# Altium footprint library myLibraryAltium.PcbLib: 215 footprints (part 12 of 14)
Each footprint in its own frame and in the unit in brackets; x right, y up, seen from the top. Pads: shape width x height; smd on the part's side, far side on the other; paste and mask are expansions set on the pad; w line width, h text height; cw(c..) or ccw(c..) is an arc to the next point about the centre after c.
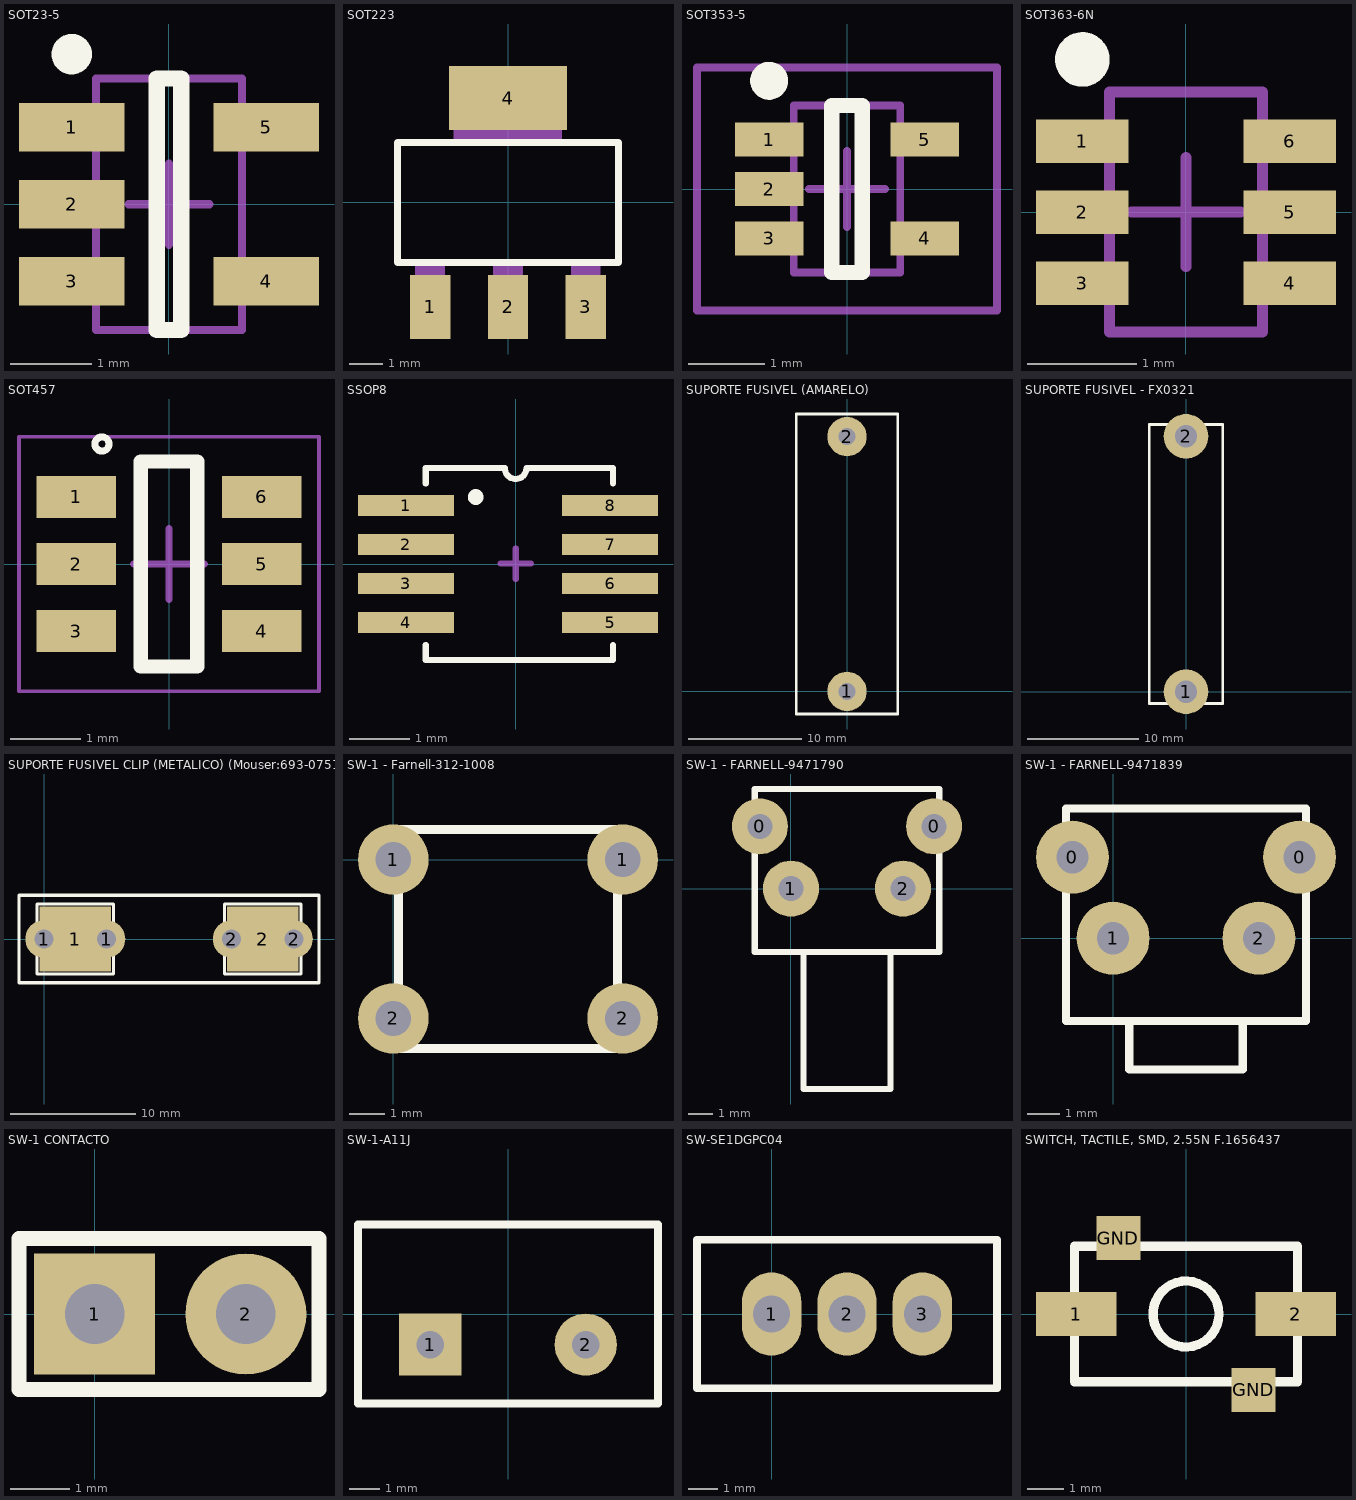
[diagram p11: the footprints below, top view; thin cyan lines are the x and y axes]

## SOT23-5 [mm] "SOT23, 5-Leads, Body 2.9x1.6mm, Pitch 0.95mm, Lead Span 2.8mm, IPC Low Density"
height 1.45
pads (5):
  rect 1.3x0.6 smd mask+0.05: 1(-1.2,0.95) 2(-1.2,0) 3(-1.2,-0.95) 4(1.2,-0.95) 5(1.2,0.95)
Top Overlay:
  circle w0.25: c-1.2,1.85 r0.125
  lines w0.2: -0.15,-1.55 -0.15,1.55 0.15,1.55 0.15,-1.55 -0.15,-1.55
Mechanical 13:
  lines w0.1: -0.9,-1.55 0.9,-1.55 0.9,1.55 -0.9,1.55 -0.9,-1.55
Mechanical 15:
  lines w0.1: -0.5,0 0.5,0 ; 0,-0.5 0,0.5
3D body "SW3DPS-SOT-23-5-DEFAULT.STEP": height 1.05, standoff -0.05, extent -1.275,-1.525 1.225,1.475

## SOT223 [mm]
pads (4):
  rect 1.2x1.9 smd: 1(-2.311,-3.099) 2(0,-3.099) 3(2.311,-3.099)
  rect 3.5x1.9 smd: 4(0,3.099)
Top Overlay:
  lines w0.203: -3.277,-1.778 -3.277,1.778 3.277,1.778 3.277,-1.778 -3.277,-1.778
Mechanical 1:
  region: 1.881,-1.803 2.743,-1.803 2.743,-3.66 1.881,-3.66
  region: -2.748,-1.803 -1.88,-1.803 -1.88,-3.664 -2.748,-3.664
  region: -0.432,-1.803 0.432,-1.803 0.432,-3.66 -0.432,-3.66
  region: -1.603,3.658 1.6,3.658 1.6,1.807 -1.603,1.807
  region: 1.883,-1.803 2.743,-1.803 2.743,-3.663 1.883,-3.663
  region: -2.747,-1.803 -1.88,-1.803 -1.88,-3.663 -2.747,-3.663
  region: -0.432,-1.803 0.432,-1.803 0.432,-3.662 -0.432,-3.662
  region: -1.601,3.658 1.6,3.658 1.6,1.804 -1.601,1.804
3D body "User Library-SOT223-3.STEP": height 1.7, standoff 0, extent -3.25,-3.5 3.25,3.5

## SOT353-5 [mm] "SOT353, 5-Leads, Body 2x1.3mm, Pitch 0.65mm, Lead Span 2.1mm, IPC Low Density"
height 1.1
pads (5):
  rect 0.9x0.45 smd: 1(-1.025,0.65) 2(-1.025,0) 3(-1.025,-0.65) 4(1.025,-0.65) 5(1.025,0.65)
Top Overlay:
  circle w0.25: c-1.025,1.425 r0.125
  lines w0.2: -0.2,-1.1 0.2,-1.1 0.2,1.1 -0.2,1.1 -0.2,-1.1
Mechanical 13:
  lines w0.1: -0.7,-1.1 -0.7,1.1 0.7,1.1 0.7,-1.1 -0.7,-1.1
Mechanical 15:
  lines w0.1: -0.5,0 0.5,0 ; 0,-0.5 0,0.5 ; -1.975,-1.6 -1.975,1.6 1.975,1.6 1.975,-1.6 -1.975,-1.6
3D body: height 1.1, standoff 0, extent -0.7,-1.1 0.7,1.1

## SOT363-6N [mm] "SOT363, 6-Leads, Body 2x1.3mm, Pitch 0.65mm, Lead Span 2.1mm, IPC Medium Density"
height 1
pads (6):
  rect 0.85x0.4 smd: 1(-0.95,0.65) 2(-0.95,0) 3(-0.95,-0.65) 4(0.95,-0.65) 5(0.95,0) 6(0.95,0.65)
Top Overlay:
  circle w0.25: c-0.95,1.4 r0.125
Mechanical 13:
  lines w0.1: -0.7,-1.1 -0.7,1.1 0.7,1.1 0.7,-1.1 -0.7,-1.1
Mechanical 15:
  lines w0.1: -0.5,0 0.5,0 ; 0,-0.5 0,0.5
3D body: height 1, standoff 0, extent -0.7,-1.1 0.7,1.1

## SOT457 [mm] "SOT457,125"
height 1.1
pads (6):
  rect 1.125x0.6 smd: 1(-1.312,0.95) 2(-1.312,0) 3(-1.312,-0.95) 4(1.312,-0.95) 5(1.312,0) 6(1.312,0.95)
Top Overlay:
  circle w0.1: c-0.95,1.7 r0.1
  lines w0.2: -0.4,-1.45 -0.4,1.45 0.4,1.45 0.4,-1.45 -0.4,-1.45
Mechanical 15:
  lines w0.1: -0.5,0 0.5,0 ; 0,-0.5 0,0.5
Mechanical 20:
  lines w0.05: -2.125,-1.8 -2.125,1.8 2.125,1.8 2.125,-1.8 -2.125,-1.8
3D body "User Library-SOT457.STEP": height 1, standoff 0, extent -1.425,-1.5 1.375,1.5

## SSOP8 [mm] "Source: Pads"
pads (8):
  rect 1.6x0.35 smd mask+0.05: 1(-1.827,0.975) 2(-1.827,0.325) 3(-1.827,-0.325) 4(-1.827,-0.975) 5(1.573,-0.975) 6(1.573,-0.325) 7(1.573,0.325) 8(1.573,0.975)
Top Overlay:
  lines w0.102: -1.498,-1.346 -1.498,-1.6 1.626,-1.6 1.626,-1.346 ; -1.498,1.346 -1.498,1.6 -0.18,1.6 ccw(c0,1.6) 0.18,1.6 1.626,1.6 1.626,1.346
  lines w0.254: -0.665,1.123 ccw(c-0.665,1.118) -0.66,1.118
Mechanical 3:
  lines w0.102: -0.252,0.01 0.256,0.01 ; 0.002,-0.244 0.002,0.264
3D body "User Library-SSOP-8-P-0_65.STEP": height 1.1, standoff -0.05, extent -2,-1.452 2,1.448

## SUPORTE FUSIVEL (AMARELO) [mm]
pads (2):
  round 3.5 hole 1.524: 1(0,0) 2(0,22.6)
Top Overlay:
  lines w0.254: -4.5,-2 -4.5,24.6 4.5,24.6 4.5,-2 -4.5,-2

## SUPORTE FUSIVEL - FX0321 [mm]
pads (2):
  round 4 hole 2: 1(0,0) 2(0,22.9)
Top Overlay:
  lines w0.254: -3.3,-1.05 -3.3,23.95 3.3,23.95 3.3,-1.05 -3.3,-1.05

## SUPORTE FUSIVEL CLIP (METALICO) (Mouser:693-0751.0110) [mm]
pads (6):
  round 3 hole 1.5: 1(0,0) 1(5,0) 2(15,0) 2(20,0)
  rect 5.7x5.2 / inner rect 5.7x3 / far side rect 5.7x3 all layers, no hole: 1(2.5,0) 2(17.5,0)
Top Overlay:
  lines w0.254: -2,-3.5 22,-3.5 22,3.5 -2,3.5 -2,-3.5 ; -0.55,-2.8 -0.55,2.8 5.55,2.8 5.55,-2.8 -0.55,-2.8 ; 14.45,-2.8 14.45,2.8 20.55,2.8 20.55,-2.8 14.45,-2.8

## SW-1 - Farnell-312-1008 [mm] "PUSH BUTTOM"
pads (4):
  round 2 hole 1: 1(0,0) 1(6.5,0) 2(0,-4.5) 2(6.5,-4.5)
Top Overlay:
  lines w0.254: 0.15,-5.35 6.35,-5.35 6.35,0.85 0.15,0.85 0.15,-5.35

## SW-1 - FARNELL-9471790 [mm] "PUSH BUTTOM 90º"
pads (4):
  round 2.25 hole 1: 0(-1.25,2.5) 0(5.75,2.5) 1(0,0) 2(4.5,0)
Top Overlay:
  lines w0.254: 0.5,-2.55 0.5,-8.05 4,-8.05 4,-2.55 ; -1.45,-2.55 -1.45,4 5.95,4 5.95,-2.55 -1.45,-2.55

## SW-1 - FARNELL-9471839 [mm] "PUSH BUTTOM 90º"
pads (4):
  round 2.25 hole 1: 0(-1.25,2.5) 0(5.75,2.5) 1(0,0) 2(4.5,0)
Top Overlay:
  lines w0.254: 0.5,-2.55 0.5,-4.05 4,-4.05 4,-2.55 ; -1.45,-2.55 -1.45,4 5.95,4 5.95,-2.55 -1.45,-2.55

## SW-1 CONTACTO [mil]
pads (2):
  rect 80x80 hole 39.37: 1(0,0)
  round 80 hole 39.37: 2(100,0)
Top Overlay:
  lines w10: -50,-50 148.42,-50 148.42,50 -50,50 -50,-50

## SW-1-A11J [mm]
pads (2):
  rect 2.032x2.032 hole 0.9: 1(-2.54,-1)
  round 2.032 hole 0.9: 2(2.54,-1)
Top Overlay:
  lines w0.254: -4.9,-2.92 4.9,-2.92 4.9,2.92 -4.9,2.92 -4.9,-2.92
3D body "a-12ap.stp": height 22.82, standoff -3.1, extent -4.9,-3.025 4.9,2.815

## SW-SE1DGPC04 [mm] "SLIDE SWITCH, SPDT, VERT"
pads (3):
  oval 2x2.8 hole 1.25: 1(0,0) 2(2.54,0) 3(5.08,0)
Top Overlay:
  lines w0.254: -2.51,-2.5 7.59,-2.5 7.59,2.5 -2.51,2.5 -2.51,-2.5

## SWITCH, TACTILE, SMD, 2.55N F.1656437 [mm]
pads (4):
  rect 2.2x1.2 smd: 1(-3,0) 2(3,0)
  rect 1.2x1.2 smd: GND(-1.85,2.075) GND(1.85,-2.075)
Top Overlay:
  circle w0.254: c0,0 r0.9
  lines w0.254: -3.05,-1.85 -3.05,1.85 3.05,1.85 3.05,-1.85 -3.05,-1.85